# Altium footprint library INPUT_PCB_LIBRARY.PcbLib: 58 footprints (part 3 of 4)
Each footprint in its own frame and in the unit in brackets; x right, y up, seen from the top. Pads: shape width x height; smd on the part's side, far side on the other; paste and mask are expansions set on the pad; w line width, h text height; cw(c..) or ccw(c..) is an arc to the next point about the centre after c.
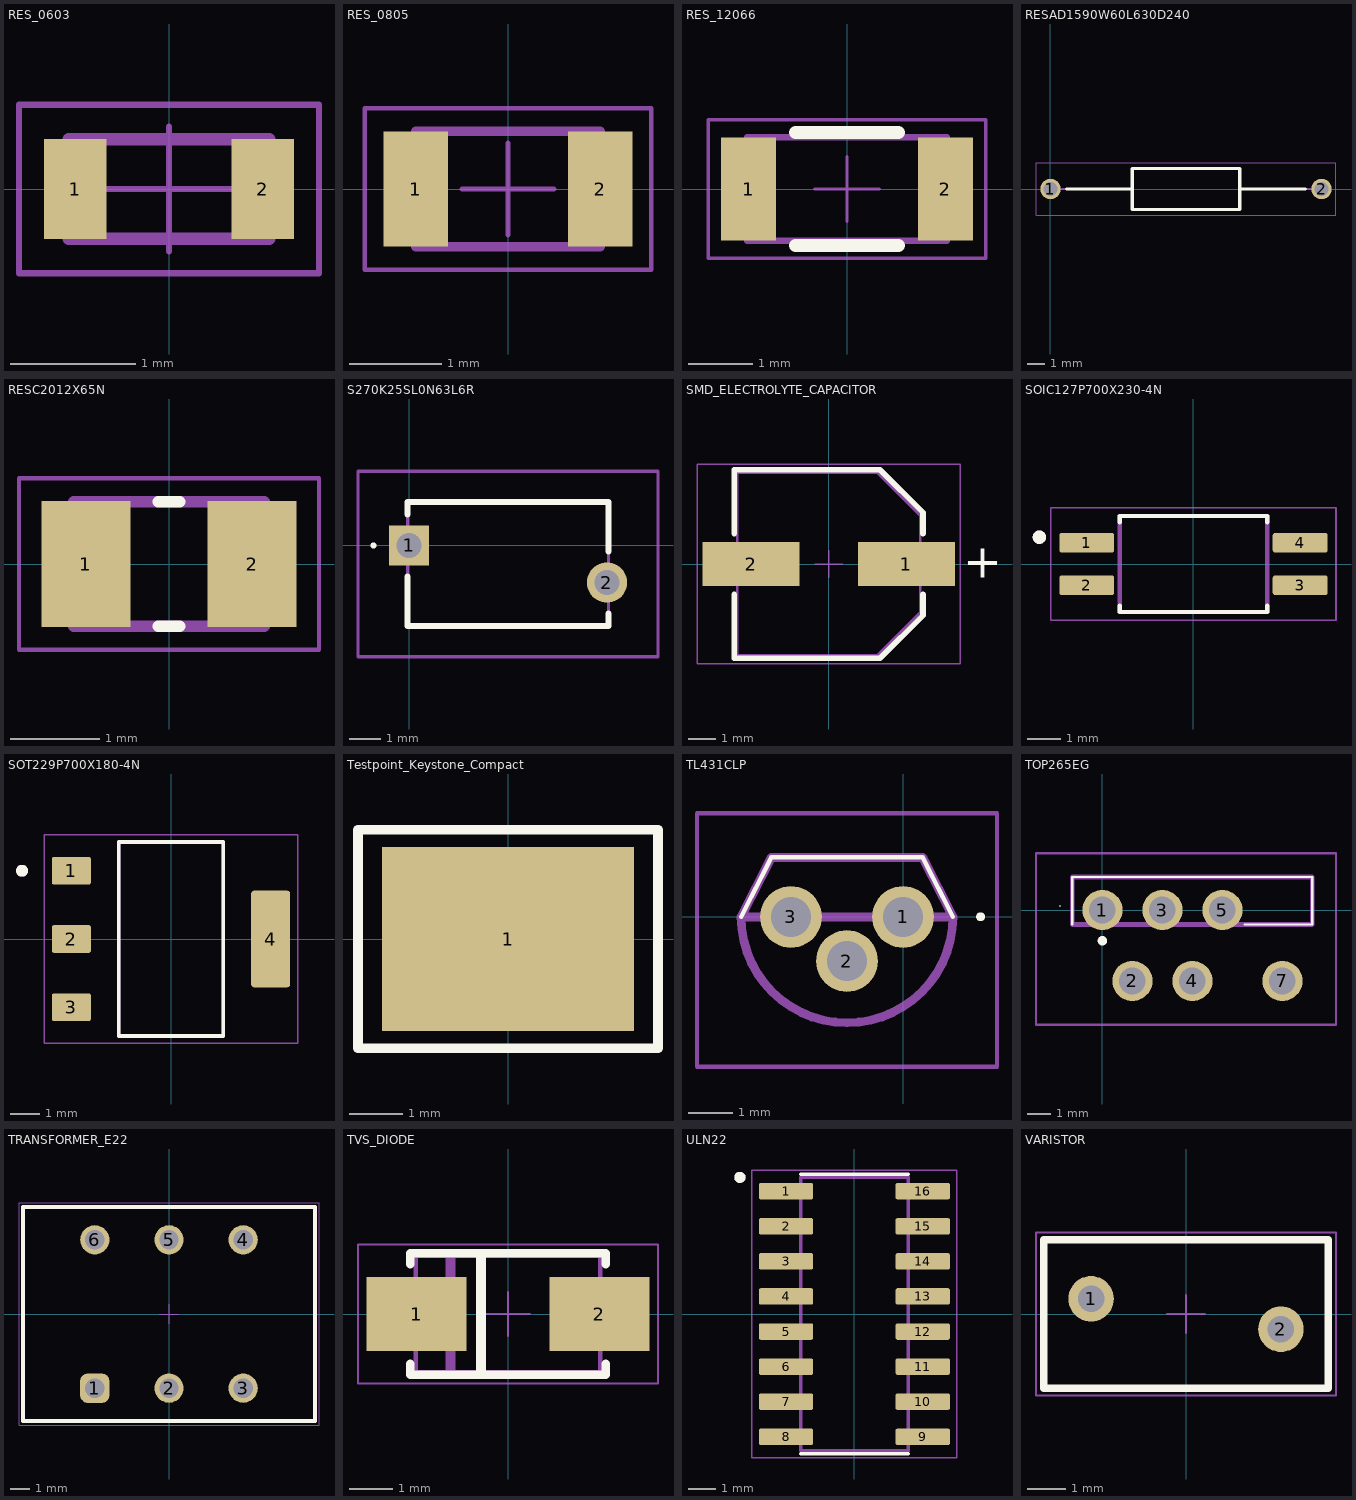
[diagram p2: the footprints below, top view; thin cyan lines are the x and y axes]

## RES_0603 [mm] "Thick Film Resistors, SMT, body size 1.6x0.8mm"
height 0.45
pads (2):
  rect 0.5x0.8 smd: 1(-0.75,0) 2(0.75,0)
Top Courtyard:
  lines w0.05: -0.5,0 0.5,0 ; 0,-0.5 0,0.5 ; -1.2,-0.675 1.2,-0.675 1.2,0.675 -1.2,0.675 -1.2,-0.675
Top Designator:
  text ".Designator" at -2.499,-0.167 h0.5
Top Component Outline:
  lines w0.1: -0.8,-0.4 0.8,-0.4 0.8,0.4 -0.8,0.4 -0.8,-0.4
3D body "WRIS-KSKE_0603.stp": height 0.45, standoff 0, extent -0.8,-0.4 0.8,0.4

## RES_0805 [mm] "Thick Film Resistors, SMT, body size 2x1.25mm"
height 0.6
pads (2):
  rect 0.7x1.25 smd: 1(-1,0) 2(1,0)
Top Courtyard:
  lines w0.05: -0.5,0 0.5,0 ; 0,-0.5 0,0.5 ; -1.55,-0.875 1.55,-0.875 1.55,0.875 -1.55,0.875 -1.55,-0.875
Top Designator:
  text ".Designator" at -2.499,-0.167 h0.5
Top Component Outline:
  lines w0.1: -1,-0.625 1,-0.625 1,0.625 -1,0.625 -1,-0.625
3D body "WRIS-KSKE_0805.stp": height 0.6, standoff 0, extent -1,-0.625 1,0.625

## RES_12066 [mm] "Thick Film Resistors, SMT, body size 3.1x1.6mm"
height 0.6
pads (2):
  rect 0.85x1.6 smd: 1(-1.525,0) 2(1.525,0)
Top Overlay:
  lines w0.2: -0.8,-0.875 0.8,-0.875 ; -0.8,0.875 0.8,0.875
Top Courtyard:
  lines w0.05: -0.5,0 0.5,0 ; 0,-0.5 0,0.5 ; -2.15,-1.075 -2.15,1.075 2.15,1.075 2.15,-1.075 -2.15,-1.075
Top Designator:
  text ".Designator" at -4.998,-0.333 h1
Top Component Outline:
  lines w0.1: -1.55,-0.8 -1.55,0.8 1.55,0.8 1.55,-0.8 -1.55,-0.8
3D body "WRIS-KSKE_1206.stp": height 0.6, standoff 0, extent -1.55,-0.8 1.55,0.8

## RESAD1590W60L630D240 [mm]
pads (2):
  round 1.2 hole 0.8: 1(0,0) 2(15.9,0)
Top Overlay:
  lines w0.2: 0.95,0 4.8,0 ; 11.1,0 14.95,0 ; 4.8,-1.2 4.8,1.2 11.1,1.2 11.1,-1.2 4.8,-1.2
Mechanical 13:
  lines w0.1: 0,0 4.8,0 ; 11.1,0 15.9,0 ; 4.8,-1.2 4.8,1.2 11.1,1.2 11.1,-1.2 4.8,-1.2
Mechanical 15:
  lines w0.05: -0.85,-1.55 -0.85,1.55 16.75,1.55 16.75,-1.55 -0.85,-1.55
3D body "MFR-25FBF52-1K.stp": height 2.6, standoff -2.6, extent -0.3,-1.291 16.2,1.291

## RESC2012X65N [mm]
pads (2):
  rect 1x1.42 smd: 1(-0.935,0) 2(0.935,0)
Top Overlay:
  lines w0.127: -0.12,-0.7 0.12,-0.7 ; -0.12,0.7 0.12,0.7
Mechanical 13:
  lines w0.127: -1.07,-0.7 1.07,-0.7 1.07,0.7 -1.07,0.7 -1.07,-0.7
Mechanical 15:
  lines w0.05: -1.685,-0.962 1.685,-0.962 1.685,0.962 -1.685,0.962 -1.685,-0.962
3D body "CRG0805F1K2.STEP": height 0.66, standoff 0.01, extent -0.984,-0.625 1.016,0.625

## S270K25SL0N63L6R [mm]
pads (2):
  rect 1.3x1.3 hole 0.8: 1(0,0)
  round 1.3 hole 0.8: 2(6.4,-1.2)
Top Overlay:
  lines w0.1: -1.2,0 cw(c-1.15,0) -1.1,0 cw(c-1.15,0) -1.2,0
  lines w0.2: -0.05,-1 -0.05,-2.6 6.45,-2.6 6.45,-2.2 ; -0.05,1 -0.05,1.4 6.45,1.4 6.45,-0.2
Mechanical 13:
  lines w0.1: -0.05,-2.6 -0.05,1.4 6.45,1.4 6.45,-2.6 -0.05,-2.6
Mechanical 15:
  lines w0.1: -1.65,-3.6 -1.65,2.4 8.05,2.4 8.05,-3.6 -1.65,-3.6
3D body "S270K25SL0N63L6R.stp": height 9.6, standoff -5, extent -0.3,-2.6 6.7,1.4

## SMD_ELECTROLYTE_CAPACITOR [mm] "Aluminium Electrolytic V-Chip SMT Capacitors, 6.3x7.7mm"
height 7.7
pads (2):
  rect 3.5x1.6 smd: 1(2.8,0) 2(-2.8,0)
Top Overlay:
  lines w0.2: -3.4,-1.1 -3.4,-3.4 1.85,-3.4 3.4,-1.85 3.4,-1.1 ; -3.4,1.1 -3.4,3.4 1.85,3.4 3.4,1.85 3.4,1.1
  text "+" at 4.85,-0.5 h1.22
Top Courtyard:
  lines w0.05: -0.5,0 0.5,0 ; 0,-0.5 0,0.5 ; -4.75,-3.6 -4.75,3.6 4.75,3.6 4.75,-3.6 -4.75,-3.6
Top Designator:
  text ".Designator" at -7.498,-0.5 h1.5
Top 3D Body:
  lines w0.1: -3.3,-3.3 1.75,-3.3 3.3,-1.75 3.3,1.75 1.75,3.3 -3.3,3.3 -3.3,-3.3
Top Component Outline:
  lines w0.1: -3.3,-3.3 1.75,-3.3 3.3,-1.75 3.3,1.75 1.75,3.3 -3.3,3.3 -3.3,-3.3
3D body "6.3x7.7x2.2.stp": height 7.7, standoff 0, extent -3.65,-3.3 3.65,3.3

## SOIC127P700X230-4N [mm]
pads (4):
  rrect25% 1.64x0.59 smd: 1(-3.185,0.635) 2(-3.185,-0.635) 3(3.185,-0.635) 4(3.185,0.635)
Top Overlay:
  circle w0.2: c-4.6,0.8 r0.1
  lines w0.127: -2.2,-1.245 -2.2,-1.43 2.2,-1.43 2.2,-1.245 ; -2.2,1.245 -2.2,1.43 2.2,1.43 2.2,1.245
Mechanical 13:
  circle w0.2: c-4.6,0.8 r0.1
  lines w0.127: -2.2,-1.43 -2.2,1.43 2.2,1.43 2.2,-1.43 -2.2,-1.43
Mechanical 15:
  lines w0.05: -4.255,-1.68 -4.255,1.68 4.255,1.68 4.255,-1.68 -4.255,-1.68

## SOT229P700X180-4N [mm]
height 1.8
pads (4):
  rrect15% 1.31x0.93 smd: 1(-3.345,2.29) 2(-3.345,0) 3(-3.345,-2.29)
  rrect15% 1.31x3.24 smd: 4(3.345,0)
Top Overlay:
  circle w0.2: c-5,2.29 r0.1
  lines w0.127: -1.753,-3.253 1.753,-3.253 1.753,3.253 -1.753,3.253 -1.753,-3.253
Mechanical 13:
  circle w0.2: c-5,2.29 r0.1
  lines w0.127: -1.753,-3.253 1.753,-3.253 1.753,3.253 -1.753,3.253 -1.753,-3.253
Mechanical 15:
  lines w0.05: -4.25,-3.502 -4.25,3.502 4.25,3.502 4.25,-3.502 -4.25,-3.502
3D body "step_temp.STEP": height 1.8, standoff 0, extent -3.499,-3.251 3.499,3.251

## Testpoint_Keystone_Compact [mil]
pads (1):
  rect 185x135 smd: 1(0,0)
Top Overlay:
  lines w7: -110,-80 -110,-70 -110,70 -110,80 -100,80 -30,80 110,80 110,-80 -100,-80 -110,-80
Top 3D Body:
  lines w5: -65.33,-22.51 -63.43,-23.14 ; -63.92,21.31 -54.27,57.33 63.59,25.75 ; -63.09,21.31 -74.92,21.31 -74.92,-18.69 -75,-20 -74.85,-20.08 -63.43,-23.14 ; 63.25,-18.69 75.08,-18.69 75.08,21.31 75.16,22.61 75.01,22.69 63.59,25.75 ; 64.08,-18.69 54.43,-54.72 -63.43,-23.14 ; 65.49,25.13 63.59,25.75
  text ".Designator" at -55,-5 h30
3D body "keystone_5016.stp": height 90.6, standoff 0.6, extent -75.08,-56.03 75.08,56.03

## TL431CLP [mm]
pads (3):
  round 1.4 hole 0.9: 1(0,0) 2(-1.27,-1) 3(-2.54,0)
Top Overlay:
  lines w0.1: -3.67,0 -2.985,1.35 0.445,1.35 1.13,0 ; 1.707,0.005 ccw(c1.758,0.005) 1.809,0.005 ccw(c1.758,0.005) 1.707,0.005
Mechanical 13:
  lines w0.2: -3.67,0 ccw(c-1.27,0) 1.13,0 ; -3.67,0 -2.985,1.35 ; -3.67,0 1.13,0 ; -2.985,1.35 0.445,1.35 ; -2.985,1.35 0.445,1.35 ; 0.445,1.35 1.13,0
Mechanical 15:
  lines w0.1: -4.67,-3.4 2.13,-3.4 2.13,2.35 -4.67,2.35 -4.67,-3.4
3D body "TL431CLPM.stp": height 12.93, standoff -4.59, extent -3.682,-2.292 1.142,1.39

## TOP265EG [mm]
pads (6):
  round 1.7 hole 1.13: 1(0,0) 2(1.27,-3) 3(2.54,0) 4(3.81,-3) 5(5.08,0) 7(7.62,-3)
Top Overlay:
  lines w0.026: -1.81,0.167 ccw(c-1.797,0.167) -1.784,0.167 ccw(c-1.797,0.167) -1.81,0.167
  lines w0.1: -1.27,-0.61 -1.27,1.4 8.89,1.4 8.89,-0.61 6.026,-0.61
  lines w0.2: -0.1,-1.3 ccw(c0,-1.3) 0.1,-1.3 ccw(c0,-1.3) -0.1,-1.3
Mechanical 13:
  lines w0.2: -1.27,-0.61 8.89,-0.61 8.89,1.4 -1.27,1.4 -1.27,-0.61
Mechanical 15:
  lines w0.1: -2.81,-4.85 9.89,-4.85 9.89,2.4 -2.81,2.4 -2.81,-4.85
3D body "TOP254EN.stp": height 8.35, standoff -5, extent -1.27,-3.462 8.89,1.4

## TRANSFORMER_E22 [mm] "Off-Line Transformer, size E13/7/4, body 15x11mm"
height 16.8
pads (6):
  rrect50% 1.5x1.5 hole 1: 1(-3.81,-3.81)
  round 1.5 hole 1: 2(0,-3.81) 3(3.81,-3.81) 4(3.81,3.81) 5(0,3.81) 6(-3.81,3.81)
Top Overlay:
  lines w0.2: -7.5,-5.5 -7.5,5.5 7.5,5.5 7.5,-5.5 -7.5,-5.5
Top Courtyard:
  lines w0.05: -0.5,0 0.5,0 ; 0,-0.5 0,0.5 ; -7.7,-5.7 -7.7,5.7 7.7,5.7 7.7,-5.7 -7.7,-5.7
Top Designator:
  text ".Designator" at -7.498,-0.5 h1.5
Top Component Outline:
  lines w0.1: -7.5,-5.5 -7.5,5.5 7.5,5.5 7.5,-5.5 -7.5,-5.5
3D body "E13_Vertical_7491181024.stp": height 16.85, standoff -3.45, extent -7.5,-5.5 7.5,5.5

## TVS_DIODE [mm] "Power TVS Diode, 2-Leads. body 4.24x2.67mm"
height 2.5
pads (2):
  rect 2.3x1.7 smd: 1(-2.1,0) 2(2.1,0)
Top Overlay:
  rectangle: -0.735,-1.4 -0.505,1.4
  lines w0.2: -2.25,-1.15 -2.25,-1.4 2.25,-1.4 2.25,-1.15 ; -2.25,1.15 -2.25,1.4 2.25,1.4 2.25,1.15
Top Courtyard:
  lines w0.05: -0.5,0 0.5,0 ; 0,-0.5 0,0.5 ; -3.45,-1.6 -3.45,1.6 3.45,1.6 3.45,-1.6 -3.45,-1.6
Top Designator:
  text ".Designator" at -4.998,-0.333 h1
Top Component Outline:
  rectangle: -1.435,-1.335 -1.205,1.335
  lines w0.1: -2.12,-1.335 -2.12,1.335 2.12,1.335 2.12,-1.335 -2.12,-1.335
3D body "WE-TVSP_DO-214AC_Unidirectional.stp": height 2.24, standoff 0, extent -2.555,-1.335 2.555,1.335

## ULN22 [mm]
pads (16):
  rrect25% 1.97x0.6 smd: 1(-2.475,4.445) 2(-2.475,3.175) 3(-2.475,1.905) 4(-2.475,0.635) 5(-2.475,-0.635) 6(-2.475,-1.905) 7(-2.475,-3.175) 8(-2.475,-4.445) 9(2.475,-4.445) 10(2.475,-3.175) 11(2.475,-1.905) 12(2.475,-0.635) 13(2.475,0.635) 14(2.475,1.905) 15(2.475,3.175) 16(2.475,4.445)
Top Overlay:
  circle w0.2: c-4.145,4.945 r0.1
  lines w0.127: -1.95,-5.065 1.95,-5.065 ; -1.95,5.065 1.95,5.065
Mechanical 13:
  circle w0.2: c-4.145,4.945 r0.1
  lines w0.127: -1.95,-4.95 -1.95,4.95 1.95,4.95 1.95,-4.95 -1.95,-4.95
Mechanical 15:
  lines w0.05: -3.71,-5.2 -3.71,5.2 3.71,5.2 3.71,-5.2 -3.71,-5.2
3D body "step_temp.STEP": height 1.75, standoff 0, extent -2.997,-4.953 2.997,4.953

## VARISTOR [mm] "Disk Varistor, Diameter 7.5mm, Width 3.9mm"
height 10.5
pads (2):
  round 1.2 hole 0.7: 1(-2.5,0.4) 2(2.5,-0.4)
Top Overlay:
  lines w0.2: -3.75,-1.95 -3.75,1.95 3.75,1.95 3.75,-1.95 -3.75,-1.95
Top Courtyard:
  lines w0.05: -0.5,0 0.5,0 ; 0,-0.5 0,0.5 ; -3.95,-2.15 -3.95,2.15 3.95,2.15 3.95,-2.15 -3.95,-2.15
Top Designator:
  text ".Designator" at -7.498,-0.5 h1.5
Top Component Outline:
  lines w0.1: -3.75,-1.95 3.75,-1.95 3.75,1.95 -3.75,1.95 -3.75,-1.95
3D body "820556001.stp": height 8.14, standoff -22.85, extent -2.997,-1.45 2.998,1.45